# Altium footprint library IntLib.PcbLib: 221 footprints (part 4 of 14)
Each footprint in its own frame and in the unit in brackets; x right, y up, seen from the top. Pads: shape width x height; smd on the part's side, far side on the other; paste and mask are expansions set on the pad; w line width, h text height; cw(c..) or ccw(c..) is an arc to the next point about the centre after c.
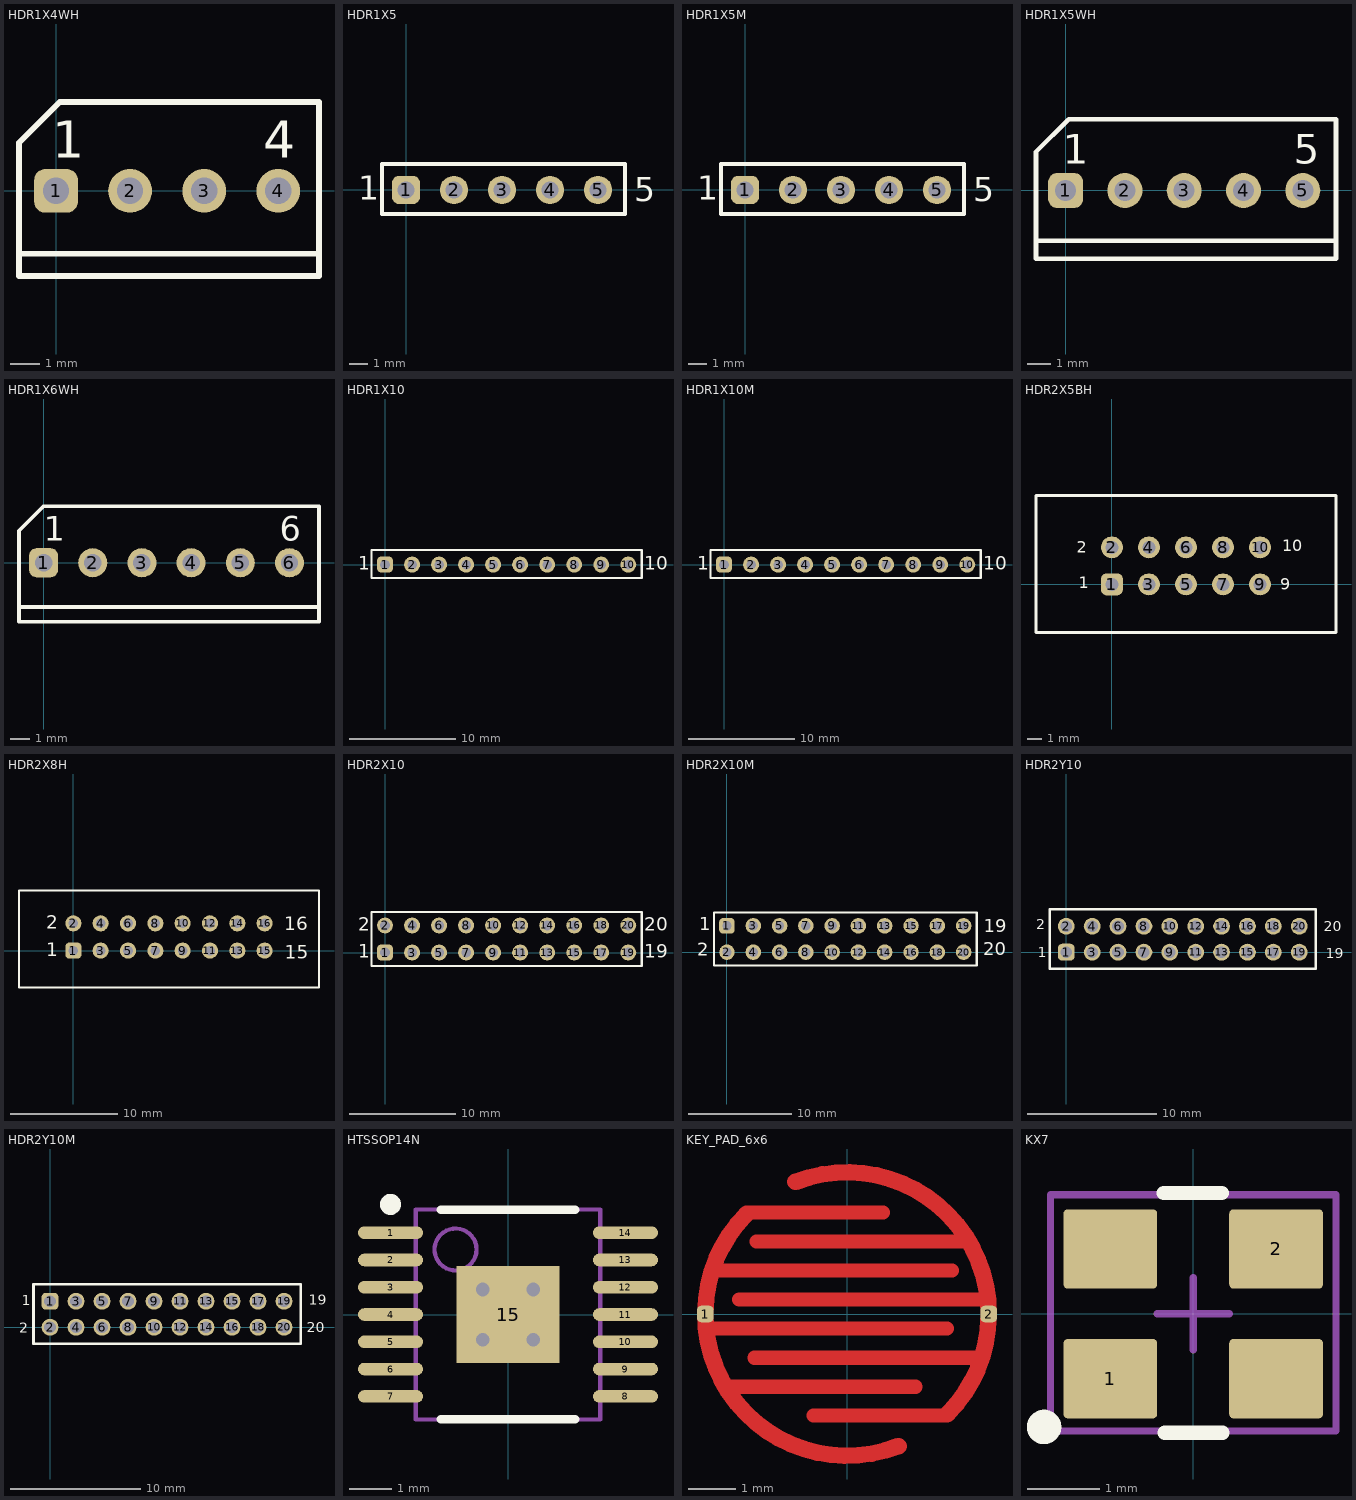
[diagram p3: the footprints below, top view; thin cyan lines are the x and y axes]

## HDR1X4WH [mm] "Connector; Header; 4x1 Position"
pads (4):
  rrect50% 1.5x1.5 hole 0.9: 1(0,0)
  round 1.5 hole 0.9: 2(2.54,0) 3(5.08,0) 4(7.62,0)
Top Overlay:
  lines w0.2: -1.27,-2.159 9.017,-2.159 ; -1.27,-2.921 -1.27,1.651 0.127,3.048 9.017,3.048 9.017,-2.921 -1.27,-2.921
  text "1" at -0.127,1.143 h1.27
  text "4" at 7.112,1.143 h1.27
3D body: height 11.75, standoff -3.49, extent -1.27,-2.921 8.89,2.921

## HDR1X5 [mm] "Connector; Header; 5x1 Position"
pads (5):
  rrect50% 1.5x1.5 hole 0.9: 1(0,0)
  round 1.5 hole 0.9: 2(2.54,0) 3(5.08,0) 4(7.62,0) 5(10.16,0)
Top Overlay:
  lines w0.2: -1.27,-1.27 -1.27,1.372 11.582,1.372 11.582,-1.27 0.635,-1.27 -1.27,-1.27
  text "1" at -2.54,-0.508 h1.27
  text "5" at 12.065,-0.584 h1.27
3D body: height 8.54, standoff -2, extent -1.245,-1.27 11.455,1.27

## HDR1X5M [mm] "Connector; Header; 5x1 Position"
pads (5):
  rrect50% 1.5x1.5 hole 0.9: 1(0,0)
  round 1.5 hole 0.9: 2(2.54,0) 3(5.08,0) 4(7.62,0) 5(10.16,0)
Top Overlay:
  lines w0.2: -1.27,-1.27 -1.27,1.372 11.582,1.372 11.582,-1.27 0.635,-1.27 -1.27,-1.27
  text "1" at -2.54,-0.508 h1.27
  text "5" at 12.065,-0.584 h1.27
3D body: height 8.5, standoff -3, extent -1.52,-1.295 11.68,1.245

## HDR1X5WH [mm] "Connector; Header; 5x1 Position"
pads (5):
  rrect50% 1.5x1.5 hole 0.9: 1(0,0)
  round 1.5 hole 0.9: 2(2.54,0) 3(5.08,0) 4(7.62,0) 5(10.16,0)
Top Overlay:
  lines w0.2: -1.27,-2.159 11.582,-2.159 ; -1.27,-2.921 -1.27,1.651 0.127,3.048 11.582,3.048 11.582,-2.921 -1.27,-2.921
  text "1" at -0.127,1.143 h1.27
  text "5" at 9.779,1.143 h1.27
3D body: height 11.75, standoff -3.49, extent -1.27,-2.921 11.43,2.921

## HDR1X6WH [mm] "Connector; Header; 6x1 Position"
pads (6):
  rrect50% 1.5x1.5 hole 0.9: 1(0,0)
  round 1.5 hole 0.9: 2(2.54,0) 3(5.08,0) 4(7.62,0) 5(10.16,0) 6(12.7,0)
Top Overlay:
  lines w0.2: -1.27,-2.286 14.224,-2.286 ; -1.27,-3.048 -1.27,1.651 0,2.921 14.224,2.921 14.224,-3.048 -1.27,-3.048
  text "6" at 12.192,1.143 h1.27
  text "1" at 0,1.143 h1.27
3D body: height 11.71, standoff -3.5, extent -1.27,-3.023 13.97,3.023

## HDR1X10 [mm] "Connector; Header; 10x1 Position"
pads (10):
  rrect50% 1.5x1.5 hole 0.9: 1(0,0)
  round 1.5 hole 0.9: 2(2.54,0) 3(5.08,0) 4(7.62,0) 5(10.16,0) 6(12.7,0) 7(15.24,0) 8(17.78,0) 9(20.32,0) 10(22.86,0)
Top Overlay:
  lines w0.2: -1.27,-1.27 -1.27,1.372 24.13,1.372 24.13,-1.27 0.635,-1.27 -1.27,-1.27
  text "1" at -2.54,-0.508 h1.27
  text "10" at 24.384,-0.508 h1.27
3D body: height 8.54, standoff -2, extent -1.245,-1.245 24.155,1.295

## HDR1X10M [mm] "Connector; Header; 10x1 Position"
pads (10):
  rrect50% 1.5x1.5 hole 0.9: 1(0,0)
  round 1.5 hole 0.9: 2(2.54,0) 3(5.08,0) 4(7.62,0) 5(10.16,0) 6(12.7,0) 7(15.24,0) 8(17.78,0) 9(20.32,0) 10(22.86,0)
Top Overlay:
  lines w0.2: -1.27,-1.27 -1.27,1.372 24.13,1.372 24.13,-1.27 0.635,-1.27 -1.27,-1.27
  text "1" at -2.54,-0.508 h1.27
  text "10" at 24.384,-0.508 h1.27
3D body: height 8.5, standoff -2, extent -1.499,-1.245 24.301,1.255

## HDR2X5BH [mm] "Connector; Header; 10x2 Position 2.0mm"
pads (10):
  rrect50% 1.5x1.5 hole 0.9: 1(0,0)
  round 1.5 hole 0.9: 2(0,2.54) 3(2.54,0) 4(2.54,2.54) 5(5.08,0) 6(5.08,2.54) 7(7.62,0) 8(7.62,2.54) 9(10.16,0) 10(10.16,2.54)
Top Overlay:
  lines w0.2: -5.207,-3.302 -5.207,6.096 15.367,6.096 15.367,-3.302 -5.207,-3.302
  text "10" at 11.684,2.286 h0.8
  text "9" at 11.557,-0.381 h0.8
  text "1" at -2.286,-0.254 h0.8
  text "2" at -2.413,2.159 h0.8
3D body: height 8.84, standoff -3.3, extent -5.08,-3.203 15.28,5.997

## HDR2X8H [mm] "Connector; Header; 10x2 Position"
pads (16):
  rrect50% 1.5x1.5 hole 0.9: 1(0,0)
  round 1.5 hole 0.9: 2(0,2.54) 3(2.54,0) 4(2.54,2.54) 5(5.08,0) 6(5.08,2.54) 7(7.62,0) 8(7.62,2.54) 9(10.16,0) 10(10.16,2.54) 11(12.7,0) 12(12.7,2.54) 13(15.24,0) 14(15.24,2.54) 15(17.78,0) 16(17.78,2.54)
Top Overlay:
  lines w0.2: -5.055,-3.429 -5.055,5.588 22.835,5.588 22.835,-3.429 -5.055,-3.429
  text "2" at -2.54,2.032 h1.27
  text "1" at -2.54,-0.508 h1.27
  text "15" at 19.634,-0.737 h1.27
  text "16" at 19.609,1.905 h1.27
3D body: height 8.9, standoff -3.5, extent -5.055,-3.429 22.845,5.571

## HDR2X10 [mm] "Connector; Header; 10x2 Position"
pads (20):
  rrect50% 1.5x1.5 hole 0.9: 1(0,0)
  round 1.5 hole 0.9: 2(0,2.54) 3(2.54,0) 4(2.54,2.54) 5(5.08,0) 6(5.08,2.54) 7(7.62,0) 8(7.62,2.54) 9(10.16,0) 10(10.16,2.54) 11(12.7,0) 12(12.7,2.54) 13(15.24,0) 14(15.24,2.54) 15(17.78,0) 16(17.78,2.54) 17(20.32,0) 18(20.32,2.54) 19(22.86,0) 20(22.86,2.54)
Top Overlay:
  lines w0.2: -1.27,-1.27 0.635,-1.27 24.13,-1.27 24.13,3.81 0.635,3.81 -1.27,3.81 -1.27,-1.27
  text "20" at 24.384,2.032 h1.27
  text "19" at 24.384,-0.508 h1.27
  text "1" at -2.54,-0.508 h1.27
  text "2" at -2.54,2.032 h1.27
3D body: height 9.5, standoff -3.2, extent -1.27,-1.219 24.13,3.861

## HDR2X10M [mm] "Connector; Header; 10x2 Position"
pads (20):
  rrect50% 1.5x1.5 hole 0.9: 1(0,2.54)
  round 1.5 hole 0.9: 2(0,0) 3(2.54,2.54) 4(2.54,0) 5(5.08,2.54) 6(5.08,0) 7(7.62,2.54) 8(7.62,0) 9(10.16,2.54) 10(10.16,0) 11(12.7,2.54) 12(12.7,0) 13(15.24,2.54) 14(15.24,0) 15(17.78,2.54) 16(17.78,0) 17(20.32,2.54) 18(20.32,0) 19(22.86,2.54) 20(22.86,0)
Top Overlay:
  lines w0.2: -1.27,-1.27 0.635,-1.27 24.13,-1.27 24.13,3.81 0.635,3.81 -1.27,3.81 -1.27,-1.27
  text "20" at 24.765,-0.305 h1.27
  text "19" at 24.816,1.905 h1.27
  text "1" at -2.667,2.108 h1.27
  text "2" at -2.896,-0.33 h1.27
3D body: height 8.7, standoff -2.4, extent -1.397,-1.23 24.303,3.77

## HDR2Y10 [mm] "Connector; Header; 10x2 Position 2.0mm"
pads (20):
  rrect50% 1.3x1.3 hole 0.9: 1(0,0)
  round 1.3 hole 0.9: 2(0,2) 3(2,0) 4(2,2) 5(4,0) 6(4,2) 7(6,0) 8(6,2) 9(8,0) 10(8,2) 11(10,0) 12(10,2) 13(12,0) 14(12,2) 15(14,0) 16(14,2) 17(16,0) 18(16,2) 19(18,0) 20(18,2)
Top Overlay:
  lines w0.2: -1.27,-1.27 -1.27,3.099 -1.27,3.302 19.279,3.302 19.279,-1.27 0.635,-1.27 -1.27,-1.27
  text "2" at -2.337,1.753 h0.8
  text "1" at -2.184,-0.406 h0.8
  text "19" at 20.041,-0.483 h0.8
  text "20" at 19.888,1.6 h0.8
3D body: height 5.5, standoff -2.5, extent -1.016,-1.323 18.984,3.277

## HDR2Y10M [mm] "Connector; Header; 10x2 Position 2.0mm"
pads (20):
  rrect50% 1.3x1.3 hole 0.9: 1(0,2)
  round 1.3 hole 0.9: 2(0,0) 3(2,2) 4(2,0) 5(4,2) 6(4,0) 7(6,2) 8(6,0) 9(8,2) 10(8,0) 11(10,2) 12(10,0) 13(12,2) 14(12,0) 15(14,2) 16(14,0) 17(16,2) 18(16,0) 19(18,2) 20(18,0)
Top Overlay:
  lines w0.2: -1.27,-1.27 -1.27,3.099 -1.27,3.302 19.279,3.302 19.279,-1.27 0.635,-1.27 -1.27,-1.27
  text "2" at -2.388,-0.432 h0.8
  text "1" at -2.184,1.702 h0.8
  text "19" at 19.888,1.727 h0.8
  text "20" at 19.761,-0.381 h0.8
3D body: height 4.3, standoff -2.7, extent -1.016,-0.984 18.984,3.016

## HTSSOP14N [mm] "TSOP, 14-Leads, Body 5,0x4,4mm (max), Pitch 0,65mm, IPC Medium Density"
height 1.2
pads (15):
  oval 1.55x0.3 smd: 1(-2.8,1.95) 2(-2.8,1.3) 3(-2.8,0.65) 4(-2.8,0) 5(-2.8,-0.65) 6(-2.8,-1.3) 7(-2.8,-1.95) 8(2.8,-1.95) 9(2.8,-1.3) 10(2.8,-0.65) 11(2.8,0) 12(2.8,0.65) 13(2.8,1.3) 14(2.8,1.95)
  rect 2.46x2.31 smd: 15(0,0)
via -0.6,0.6 diameter 0.66 hole 0.33
via 0.6,0.6 diameter 0.66 hole 0.33
via -0.6,-0.6 diameter 0.66 hole 0.33
via 0.6,-0.6 diameter 0.66 hole 0.33
Top Overlay:
  circle w0.25: c-2.8,2.625 r0.125
  lines w0.2: -1.6,-2.5 1.6,-2.5 ; -1.6,2.5 1.6,2.5
Mechanical 13:
  circle w0.1: c-1.25,1.55 r0.5
  lines w0.1: -2.2,-2.5 -2.2,2.5 2.2,2.5 2.2,-2.5 -2.2,-2.5
Mechanical 15:
  lines w0.1: -0.5,0 0.5,0 ; 0,-0.5 0,0.5
3D body: height 1.1, standoff 0, extent -3.175,-2.515 3.225,2.485

## KEY_PAD_6x6 [mm] "Key OAD 6x6 mm Diametr"
pads (2):
  rrect50% 0.35x0.35 smd: 1(-3,0) 2(3,0)
Top Layer:
  lines w0.3: -3.005,-0.31 2.115,-0.31 ; -2.88,0.92 2.22,0.92 ; -2.6,-1.54 1.448,-1.54 ; -2.28,0.305 3.01,0.305 ; -2.125,2.15 0.762,2.15 ; -1.956,-0.925 2.88,-0.925 ; -1.915,1.535 2.605,1.535 ; -0.711,-2.15 2.115,-2.15
  lines w0.35: -2.121,2.121 ccw(c0,0) 1.09,-2.795 ; -1.09,2.795 cw(c0,0) 2.121,-2.121
Top Solder:
  lines w6.5: 0,0 0.001,0

## KX7 [mm] "KX Quartz"
height 1.5
pads (4):
  rrect10% 1.3x1.1 smd: 1(-1.15,-0.9) 2(1.15,0.9) ""(-1.15,0.9) ""(1.15,-0.9)
Top Overlay:
  circle w0.254: c-2.07,-1.57 r0.112
  lines w0.2: -0.406,1.676 0.394,1.676 ; -0.394,-1.651 0.406,-1.651
Mechanical 13:
  lines w0.1: -1.981,-1.626 -1.981,1.651 1.981,1.651 1.981,-1.626 -1.981,-1.626
Mechanical 15:
  lines w0.1: -0.5,0 0.5,0 ; 0,-0.5 0,0.5
3D body: height 0.81, standoff 0, extent -1.563,-1.225 1.651,1.275